# Altium footprint library sun_library.PcbLib: 412 footprints (part 11 of 26)
Each footprint in its own frame and in the unit in brackets; x right, y up, seen from the top. Pads: shape width x height; smd on the part's side, far side on the other; paste and mask are expansions set on the pad; w line width, h text height; cw(c..) or ccw(c..) is an arc to the next point about the centre after c.
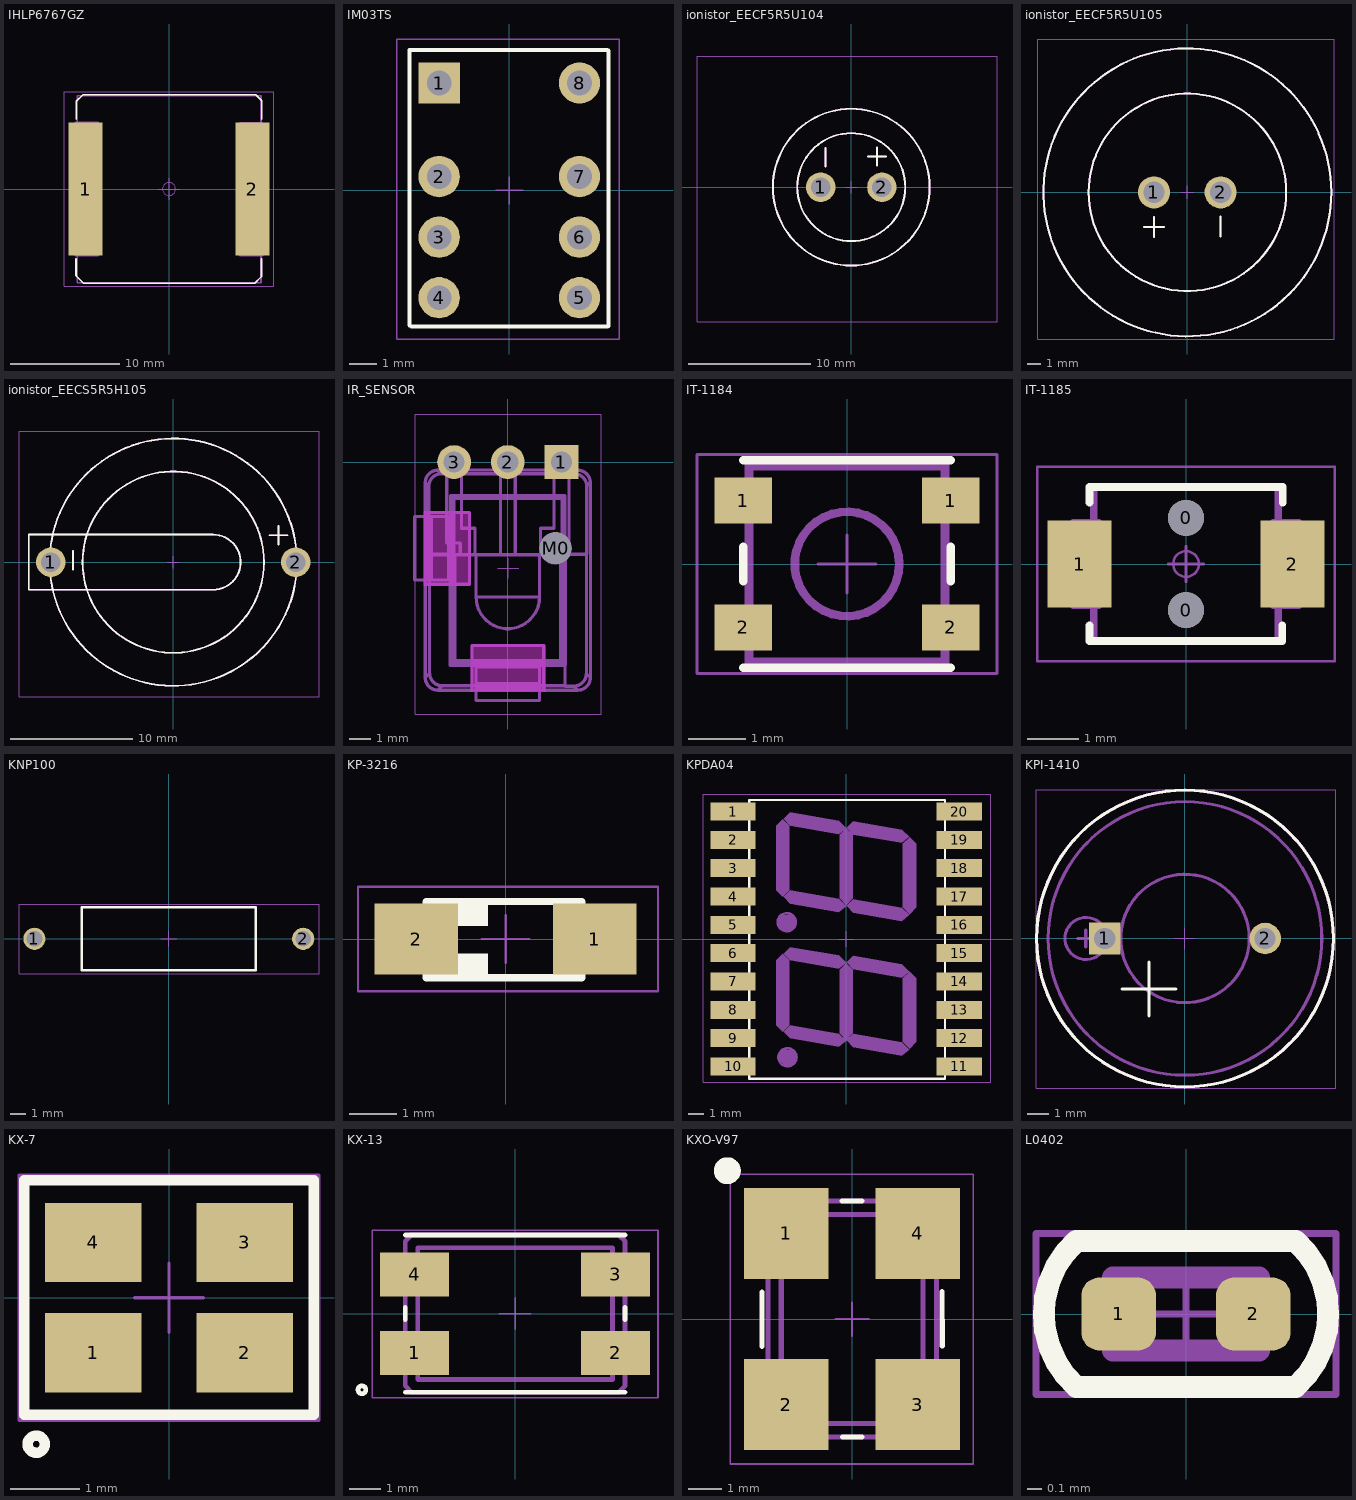
[diagram p10: the footprints below, top view; thin cyan lines are the x and y axes]

## IHLP6767GZ [mm] "SMT power inductors, IHLP6767GZ series Vishay Dale"
height 7
pads (2):
  rect 3.125x12.19 smd paste-2: 1(-7.648,0) 2(7.648,0)
Top Overlay:
  lines w0.15: -8.515,-6.392 -8.515,-7.955 -7.841,-8.629 7.866,-8.629 8.48,-8.014 8.48,-6.392 ; -8.492,6.414 -8.492,8.043 -7.883,8.651 7.949,8.651 8.503,8.097 8.503,6.414
Top Paste:
  region: -6.325,-1 -9.025,-1 -9.025,-5.8 -6.325,-5.8
  rectangle: -8.922,1.036 -6.222,5.836
  rectangle: 6.325,1 9.025,5.8
  region: 8.922,-1.036 6.222,-1.036 6.222,-5.836 8.922,-5.836
TopAssy 13:
  lines w0.15: 8.43,-8.597 8.43,8.553 ; 8.43,-8.588 -8.417,-8.588 -8.417,8.563 8.43,8.563 ; -8.587,-6.111 -8.587,6.095 -6.494,6.095 -6.494,-6.111 -8.587,-6.111 ; 6.5,-6.12 8.588,-6.12 8.588,6.085 6.5,6.085 6.5,-6.12
CourtTop 15:
  circle w0.05: c0,0 r0.6
  lines w0.05: -1,0 1,0 ; 0,-1 0,1 ; -9.6,-8.9 -9.6,8.908 9.6,8.908 9.6,-8.9 -9.6,-8.9
3D body "ihlp6767gzer330m11.stp": height 6.99, standoff 0.1, extent -8.587,-8.588 8.588,8.588

## IM03TS [mm]
pads (8):
  rect 1.5x1.5 hole 0.9: 1(-2.55,3.9)
  round 1.5 hole 0.9: 2(-2.55,0.5) 3(-2.55,-1.7) 4(-2.55,-3.9) 5(2.55,-3.9) 6(2.55,-1.7) 7(2.55,0.5) 8(2.55,3.9)
Top Overlay:
  lines w0.15: -3.625,-4.9 -3.625,5.1 ; -3.575,5.1 3.55,5.1 ; -3.55,-4.95 3.575,-4.95 ; 3.6,-4.925 3.6,5.075
CourtTop 15:
  lines w0.05: -0.5,0 0.5,0 ; 0,-0.5 0,0.5 ; -4.1,-5.4 4,-5.4 4,5.5 -4.1,5.5 -4.1,-5.4
3D body "User Library-AXICOM IMxxTS.step": height 5.3, standoff -1.8, extent -2.97,-5.1 3.03,4.9

## ionistor_EECF5R5U104 [mm]
pads (2):
  round 2.41 hole 1.6: 1(-2.5,0) 2(2.5,0)
Top Overlay:
  circle w0.15: c0,0 r6.4
  circle w0.15: c0,0 r4.41
  lines w0.15: -2.1,1.7 -2.1,3.2 ; 1.35,2.5 2.85,2.5 ; 2.1,1.75 2.1,3.25
TopAssy 13:
  circle w0.15: c0,0 r4.41
  circle w0.15: c0,0 r6.4
  lines w0.15: -2.1,1.7 -2.1,3.2 ; 1.35,2.5 2.85,2.5 ; 2.1,1.75 2.1,3.25
CourtTop 15:
  lines w0.05: -0.5,0 0.5,0 ; 0,-0.5 0,0.5 ; -12.6,-11 11.9,-11 11.9,10.7 -12.6,10.7 -12.6,-11
3D body "User Library-Ionistor_EECF5R5U104.step": height 7.5, standoff -5, extent -6.525,-6.525 6.525,6.525

## ionistor_EECF5R5U105 [mm]
pads (2):
  round 2.41 hole 1.6: 1(-2.5,0) 2(2.5,0)
Top Overlay:
  circle w0.15: c0,0 r7.406
  circle w0.15: c0,0 r10.8
  lines w0.15: -3.25,-2.6 -1.75,-2.6 ; -2.5,-3.35 -2.5,-1.85 ; 2.5,-3.3 2.5,-1.8
TopAssy 13:
  circle w0.15: c0,0 r10.8
  circle w0.15: c0,0 r7.406
  lines w0.15: -3.25,-2.6 -1.75,-2.6 ; -2.5,-3.35 -2.5,-1.85 ; 2.5,-3.3 2.5,-1.8
CourtTop 15:
  lines w0.05: -0.5,0 0.5,0 ; 0,-0.5 0,0.5 ; -11.2,-11 -11.2,11.5 11,11.5 11,-11 -11.2,-11
3D body "User Library-Ionistor_EECF5R5U105.step": height 8.01, standoff -6, extent -10.75,-10.75 10.76,10.75

## ionistor_EECS5R5H105 [mm]
pads (2):
  round 2.41 hole 1.6: 1(-10,0) 2(10,0)
Top Overlay:
  circle w0.15: c0,0 r10.1
  circle w0.15: c0,0 r7.406
  lines w0.15: -8.2,-0.6 -8.2,0.9 ; 7.85,2.2 9.35,2.2 ; 8.6,1.45 8.6,2.95 ; -11.8,-2.25 -11.8,2.25 3.25,2.25 cw(c3.25,0) 3.25,-2.25 -11.8,-2.25
TopAssy 13:
  circle w0.15: c0,0 r7.406
  circle w0.15: c0,0 r10.1
  lines w0.15: -8.2,-0.6 -8.2,0.9 ; 7.85,2.2 9.35,2.2 ; 8.6,1.45 8.6,2.95 ; -11.8,-2.25 3.25,-2.25 ccw(c3.25,0) 3.25,2.25 -11.8,2.25 -11.8,-2.25
CourtTop 15:
  lines w0.05: -0.5,0 0.5,0 ; 0,-0.5 0,0.5 ; -12.6,-11 11.9,-11 11.9,10.7 -12.6,10.7 -12.6,-11
3D body "User Library-EEC-RG0V224H1_PANASONIC.step": height 2.7, standoff -6.4, extent -5.673,-4.35 5.35,6.15

## IR_SENSOR [mm] "IR_SENSOR"
height 10
pads (4):
  rect 1.6x1.6 hole 1: 1(2.54,0)
  round 1.6 hole 1: 2(0,0) 3(-2.54,0)
  round 1.5 hole 1.5 unplated: M0(2.259,-4.083)
Bottom Overlay:
  lines w0.15: -4.05,-6.175 -4.05,-10.975 -2.1,-10.975 ; -4.05,-2.05 -4.05,1.25 4,1.25 4,-10.975 2.1,-10.975
Keep-Out Layer:
  board cut-out: 1.7,-8.687 -1.7,-8.687 -1.7,-10.787 1.7,-10.787
  board cut-out: -3.907,-2.383 -3.907,-5.783 -1.807,-5.783 -1.807,-2.383
Keep-Out Layer:
  lines w0.15: -3.907,-5.783 -3.907,-2.383 ; -3.907,-5.783 -1.807,-5.783 ; -3.907,-5.783 -3.907,-2.383 ; -3.907,-5.783 -1.807,-5.783 ; -3.907,-2.383 -1.807,-2.383 ; -3.907,-2.383 -1.807,-2.383 ; -1.807,-5.783 -1.807,-2.383 ; -1.807,-5.783 -1.807,-2.383 ; -1.7,-10.787 -1.7,-8.687 ; -1.7,-10.787 1.7,-10.787 ; -1.7,-10.787 1.7,-10.787 ; -1.7,-10.787 -1.7,-8.687 ; -1.7,-8.687 1.7,-8.687 ; -1.7,-8.687 1.7,-8.687 ; 1.7,-10.787 1.7,-8.687 ; 1.7,-10.787 1.7,-8.687
TopAssy 13:
  drawing of 983 lines, arcs and shapes, not listed
BottAssy 14:
  lines w0.15: -3.907,-5.783 -3.907,-2.383 -1.807,-2.383 -1.807,-5.783 -3.907,-5.783 ; -1.7,-10.787 1.7,-10.787 1.7,-8.687 -1.7,-8.687 -1.7,-10.787 ; 1.559,-4.083 cw(c2.259,-4.083) 2.959,-4.083 cw(c2.259,-4.083) 1.559,-4.083
CourtTop 15:
  lines w0.05: -0.475,-5.025 0.525,-5.025 ; 0.025,-5.5 0.025,-4.55 ; -4.375,-11.925 -4.375,2.275 4.425,2.275 4.425,-11.925 -4.375,-11.925
3D body "IR port_22082018.stp": height 13.5, standoff -3.1, extent -4.407,-11.297 3.907,0.2

## IT-1184 [mm] "IT-1184-160G-G, кнопка тактовая 3.3х3.3 SMD h=1.5мм"
height 1.5
pads (4):
  rect 1x0.8 smd: 1(-1.8,1.1) 1(1.8,1.1) 2(-1.8,-1.1) 2(1.8,-1.1)
Top Overlay:
  lines w0.15: -1.8,-1.8 1.8,-1.8 ; -1.8,-0.3 -1.8,0.3 ; -1.8,1.8 1.8,1.8 ; 1.8,-0.3 1.8,0.3
TopAssy 13:
  circle w0.15: c0,0 r0.906
  lines w0.15: -1.7,-1.375 -2.025,-1.375 -2.025,-0.8 -1.7,-0.8 ; -1.7,0.825 -2.025,0.825 -2.025,1.4 -1.7,1.4 ; 1.7,-1.4 2.025,-1.4 2.025,-0.825 1.7,-0.825 ; 1.7,0.8 2.025,0.8 2.025,1.375 1.7,1.375 ; -1.7,-1.7 1.7,-1.7 1.7,1.7 -1.7,1.7 -1.7,-1.7
CourtTop 15:
  lines w0.05: -0.5,0 0.5,0 ; 0,-0.5 0,0.5 ; -2.6,-1.9 -2.6,1.9 2.6,1.9 2.6,-1.9 -2.6,-1.9
3D body: height 1, standoff 0, extent -1.7,-1.7 1.7,1.7
3D body: height 1.5, standoff 0, extent -0.905,-0.905 0.905,0.905

## IT-1185 [mm]
height 2
pads (4):
  round 0.7 hole 0.7 unplated: 0(0,-0.9) 0(0,0.9)
  rect 1.25x1.7 smd: 1(-2.075,0) 2(2.075,0)
Top Overlay:
  lines w0.15: -1.88,-1.2 -1.88,-1.5 1.878,-1.5 1.878,-1.2 ; -1.88,1.2 -1.88,1.5 1.887,1.5 1.887,1.2
TopAssy 13:
  lines w0.15: -2.2,-0.8 -1.7,-0.8 -1.7,0.8 -2.2,0.8 -2.2,-0.8 ; -1.8,-1.5 1.8,-1.5 1.8,1.5 -1.8,1.5 -1.8,-1.5 ; 1.7,-0.8 2.2,-0.8 2.2,0.8 1.7,0.8 1.7,-0.8
CourtTop 15:
  circle w0.05: c0,0 r0.25
  lines w0.05: -0.35,0 0.35,0 ; 0,-0.35 0,0.35 ; -2.9,-1.9 -2.9,1.9 2.9,1.9 2.9,-1.9 -2.9,-1.9
3D body "ts-1185-a-a-a-a.stp": height 2, standoff -0.4, extent -2.5,-1.5 2.5,1.5

## KNP100 [mm] "Wirewound resistor 1Watt KNP type"
height 5
pads (2):
  round 1.4 hole 1: 1(-8.5,0) 2(8.5,0)
Top Overlay:
  lines w0.15: -5.5,-2 5.5,-2 5.5,2 -5.5,2 -5.5,-2
CourtTop 15:
  lines w0.05: -0.5,0 0.5,0 ; 0,-0.5 0,0.5 ; -9.475,-2.225 9.5,-2.225 9.5,2.2 -9.475,2.2 -9.475,-2.225

## KP-3216 [mm] "Светодиод"
pads (2):
  rect 1.75x1.5 smd: 1(1.875,0) 2(-1.875,0)
Top Overlay:
  region: -0.375,-0.3 -1.075,-0.3 -1.075,-0.8 -0.375,-0.8
  region: -0.375,0.775 -1.075,0.775 -1.075,0.275 -0.375,0.275
  lines w0.15: -1.675,-0.813 -1.675,0.787 -0.025,0.787 1.6,0.787 1.6,-0.813 -1.675,-0.813
CourtTop 15:
  lines w0.05: -0.5,0 0.5,0 ; 0,-0.5 0,0.5 ; -3.1,-1.1 3.2,-1.1 3.2,1.1 -3.1,1.1 -3.1,-1.1

## KPDA04 [mil] "Display Red"
height 148
pads (20):
  rect 118x47 smd: 1(-295.5,333) 2(-295.5,259) 3(-295.5,185) 4(-295.5,111) 5(-295.5,37) 6(-295.5,-37) 7(-295.5,-111) 8(-295.5,-185) 9(-295.5,-259) 10(-295.5,-333) 11(295.5,-333) 12(295.5,-259) 13(295.5,-185) 14(295.5,-111) 15(295.5,-37) 16(295.5,37) 17(295.5,111) 18(295.5,185) 19(295.5,259) 20(295.5,333)
Top Overlay:
  lines w5.91: -253.73,-365 -253.73,363 258.27,363 258.27,-365 -253.73,-365
CourtTop 15:
  lines w1.97: -19.69,0 19.68,0 ; 0,-19.68 0,19.68 ; -374.02,-374.02 377.95,-374.02 377.95,377.95 -374.02,377.95 -374.02,-374.02
CourtBot 16:
  circle w5.91: c-155.5,44 r24
  circle w5.91: c-153.5,-309 r24
  region: -183.5,-56 -183.5,-225 -166.5,-242 -148.5,-225 -148.5,-56 -165.5,-39
  region: -17.5,-80 -17.5,-246 0.5,-264 17.5,-246 17.5,-80 0.5,-63
  region: -146.5,-56 -19.5,-78 -0.5,-62 -19.5,-43 -146.5,-21 -163.5,-38
  region: -146.5,-260 -19.5,-282 -0.5,-266 -19.5,-247 -146.5,-225 -163.5,-242
  region: 18.5,-283 145.5,-305 164.5,-289 145.5,-270 18.5,-248 1.5,-265
  region: 18.5,-79 145.5,-101 164.5,-85 145.5,-66 18.5,-44 1.5,-61
  region: 147.5,-103 147.5,-269 165.5,-287 182.5,-269 182.5,-103 165.5,-86
  region: -130.5,-309 -130.5,-302 -144.5,-288 -145.5,-289 -163.5,-289 -163.5,-290 -176.5,-303 -174.5,-305 -174.5,-321 -170.5,-321 -159.5,-332 -157.5,-330 -143.5,-330 -131.5,-318 -131.5,-309
  region: -132.5,44 -132.5,51 -146.5,65 -147.5,64 -165.5,64 -165.5,63 -178.5,50 -176.5,48 -176.5,32 -172.5,32 -161.5,21 -159.5,23 -145.5,23 -133.5,35 -133.5,44
  region: 147.5,249 147.5,83 165.5,65 182.5,83 182.5,249 165.5,266
  region: 18.5,273 145.5,251 164.5,267 145.5,286 18.5,308 1.5,291
  region: 18.5,69 145.5,47 164.5,63 145.5,82 18.5,104 1.5,87
  region: -146.5,92 -19.5,70 -0.5,86 -19.5,105 -146.5,127 -163.5,110
  region: -146.5,296 -19.5,274 -0.5,290 -19.5,309 -146.5,331 -163.5,314
  region: -17.5,272 -17.5,106 0.5,88 17.5,106 17.5,272 0.5,289
  region: -183.5,296 -183.5,127 -166.5,110 -148.5,127 -148.5,296 -165.5,313
3D body "KPDA04-101.STEP": height 167.32, standoff 0, extent -295.78,-364 294.78,364.35

## KPI-1410 [mm] "Пьезоизлучатель"
height 7.8
pads (2):
  rect 1.5x1.5 hole 1: 1(-3.81,0)
  round 1.5 hole 1: 2(3.81,0)
Top Overlay:
  circle w0.15: c0,0 r7.05
  lines w0.15: -2.98,-2.4 -0.44,-2.4 ; -1.71,-3.67 -1.71,-1.13
TopAssy 13:
  circle w0.15: c-4.7,0 r1
  circle w0.15: c0,0 r7.05
  circle w0.15: c0,0 r3.05
  circle w0.15: c0,0 r6.5
  lines w0.15: -5.1,0 -4.3,0 ; -4.71,-0.4 -4.71,0.4
CourtTop 15:
  lines w0.05: -0.5,0 0.5,0 ; 0,-0.5 0,0.5 ; -7.075,-7.125 -7.075,7.075 7.175,7.075 7.175,-7.125 -7.075,-7.125
3D body "User Library-Buzzer14mm.step": height 7.35, standoff -3.1, extent -7.01,-7 6.99,7

## KX-7 [mm] "Quartz Crystal, SM; 4 Leads; Body 3.2 x 2.5 x 1mm (LxWxH)"
height 1
pads (4):
  rect 1.4x1.15 smd: 1(-1.1,-0.8) 2(1.1,-0.8) 3(1.1,0.8) 4(-1.1,0.8)
Top Overlay:
  circle w0.15: c-1.925,-2.125 r0.125
  lines w0.15: -2.1,-1.7 -2.1,1.7 2.1,1.7 2.1,-1.7 -2.1,-1.7
CourtTop 15:
  lines w0.05: -0.5,0 0.5,0 ; 0,-0.5 0,0.5 ; -2.175,-1.775 -2.175,1.775 2.175,1.775 2.175,-1.775 -2.175,-1.775
3D body "User Library-GeyerElectronics_KX7.step": height 0.81, standoff 0, extent -1.607,-1.3 1.607,1.2

## KX-13 [mm]
pads (4):
  rect 2.2x1.4 smd: 1(-3.2,-1.25) 2(3.2,-1.25) 3(3.2,1.25) 4(-3.2,1.25)
Top Overlay:
  circle w0.15: c-4.875,-2.425 r0.125
  lines w0.15: -3.5,-2.5 3.5,-2.5 ; -3.5,-0.2 -3.5,0.2 ; -3.5,2.5 3.5,2.5 ; 3.5,-0.2 3.5,0.2
TopAssy 13:
  lines w0.15: -3.5,-1.8 -3.675,-1.8 -3.675,-0.675 -3.5,-0.675 ; -3.5,0.7 -3.675,0.7 -3.675,1.825 -3.5,1.825 ; 3.5,-1.8 3.675,-1.8 3.675,-0.675 3.5,-0.675 ; 3.525,0.675 3.7,0.675 3.7,1.8 3.525,1.8 ; -3.5,-2.3 -3.5,2.3 -3.3,2.5 3.3,2.5 3.5,2.3 3.5,-2.3 3.3,-2.5 -3.3,-2.5 -3.5,-2.3 ; -3.1,-2.1 -3.1,2.1 3.1,2.1 3.1,-2.1 -3.1,-2.1
CourtTop 15:
  lines w0.05: -0.5,0 0.5,0 ; 0,-0.5 0,0.5 ; -4.55,-2.675 -4.55,2.65 4.55,2.65 4.55,-2.675 -4.55,-2.675
3D body "User Library-GeyerElectronics_KX13.step": height 1.31, standoff 0, extent -3.5,-2.5 3.5,2.5

## KXO-V97 [mm] "5mm x 7mm generator 4pin KXO-V97"
height 1.8
pads (4):
  rect 2.5x2.7 smd: 1(-1.95,2.54) 2(-1.95,-2.54) 3(1.95,-2.54) 4(1.95,2.54)
Top Overlay:
  circle w0.4: c-3.7,4.4 r0.2
  lines w0.15: -2.674,-0.82 -2.675,0.8 ; -0.3,3.5 0.288,3.5 ; -0.288,-3.5 0.3,-3.5 ; 2.675,-0.8 2.674,0.82
TopAssy 13:
  lines w0.15: -2.5,-3.3 -2.3,-3.5 2.3,-3.5 2.5,-3.3 2.5,3.3 2.3,3.5 -2.3,3.5 -2.5,3.3 -2.5,-3.3 ; -2.1,-3.1 -2.1,3.1 2.1,3.1 2.1,-3.1 -2.1,-3.1
CourtTop 15:
  lines w0.05: -0.5,0 0.5,0 ; 0,-0.5 0,0.5 ; -3.615,-4.3 3.6,-4.3 3.6,4.296 -3.615,4.296 -3.615,-4.3
3D body "User Library-KXO-97V.step": height 1.3, standoff 0, extent -2.54,-3.5 2.54,3.5

## L0402 [mm] "Chip Inductor Body 1.0x0.5mm, IPC High Density"
height 0.35
pads (2):
  rrect50% 0.51x0.5 smd paste-0.02 mask+0.075: 1(-0.46,0) 2(0.46,0)
Top Overlay:
  lines w0.15: -0.75,-0.5 0.75,-0.5 ; -0.75,0.5 0.75,0.5 ; -0.749,-0.499 cw(c-0.3,0) -0.748,0.501 ; 0.748,0.501 cw(c0.3,0) 0.749,-0.499
TopAssy 13:
  lines w0.15: -0.5,-0.25 -0.5,0.25 0.5,0.25 0.5,-0.25 -0.5,-0.25
CourtTop 15:
  lines w0.05: -0.3,0 0.3,0 ; 0,-0.3 0,0.3 ; -1.025,-0.55 -1.025,0.55 1.025,0.55 1.025,-0.55 -1.025,-0.55
3D body "User Library-SMD RESISTOR-0402.step": height 0.35, standoff -0.01, extent -0.5,-0.25 0.5,0.25